# Altium footprint library CRD25DA12N-FMC.PcbLib: 152 footprints (part 8 of 10)
Each footprint in its own frame and in the unit in brackets; x right, y up, seen from the top. Pads: shape width x height; smd on the part's side, far side on the other; paste and mask are expansions set on the pad; w line width, h text height; cw(c..) or ccw(c..) is an arc to the next point about the centre after c.
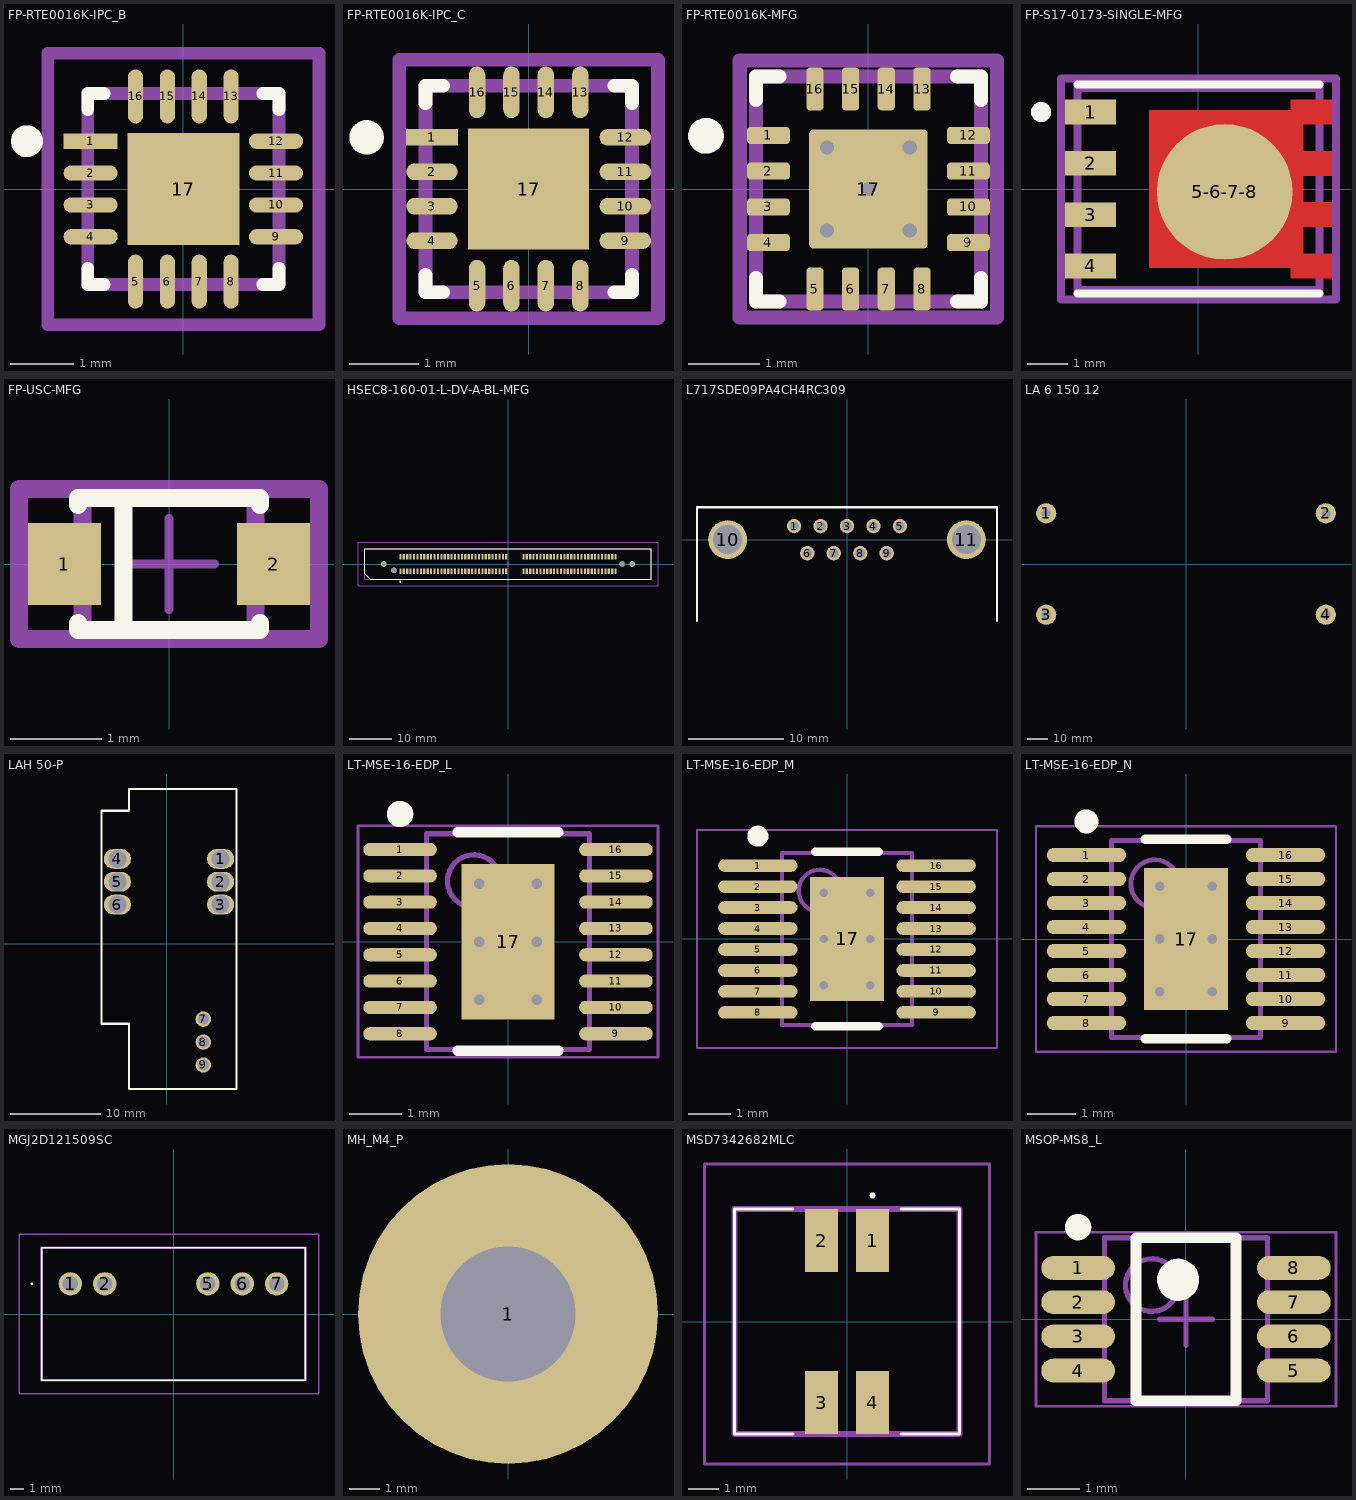
[diagram p7: the footprints below, top view; thin cyan lines are the x and y axes]

## FP-RTE0016K-IPC_B [mm]
pads (17):
  rect 0.849x0.239 smd paste+0 mask+0: 1(-1.455,0.75)
  rrect100% 0.849x0.239 smd paste+0 mask+0: 2(-1.455,0.25) 3(-1.455,-0.25) 4(-1.455,-0.75) 9(1.455,-0.75) 10(1.455,-0.25) 11(1.455,0.25) 12(1.455,0.75)
  rrect100% 0.239x0.849 smd paste+0 mask+0: 5(-0.75,-1.455) 6(-0.25,-1.455) 7(0.25,-1.455) 8(0.75,-1.455) 13(0.75,1.455) 14(0.25,1.455) 15(-0.25,1.455) 16(-0.75,1.455)
  rect 1.76x1.76 smd paste-1000 mask+0: 17(0,0)
Top Overlay:
  circle w0.25: c-2.454,0.75 r0.125
  lines w0.2: -1.5,-1.245 -1.5,-1.5 -1.245,-1.5 ; -1.5,1.245 -1.5,1.5 -1.245,1.5 ; 1.245,-1.5 1.5,-1.5 1.5,-1.245 ; 1.245,1.5 1.5,1.5 1.5,1.245
Top Paste:
  rectangle: -0.557,-0.557 0.557,0.557
Mechanical 5:
  lines w0.2: -2.129,-2.129 2.129,-2.129 2.129,2.129 -2.129,2.129 -2.129,-2.129
  text ".Designator" at 0,0.188 h1
Mechanical 13:
  lines w0.2: -1.5,-1.5 1.5,-1.5 1.5,1.5 -1.5,1.5 -1.5,-1.5
Mechanical 15:
  lines w0.2: -2.129,-2.129 2.129,-2.129 2.129,2.129 -2.129,2.129 -2.129,-2.129
Mechanical 16:
  lines w0.1: -0.5,0 0.5,0 ; 0,-0.5 0,0.5
3D body "IC_Texas_Instruments_LM51571QRTERQ1_eec.STEP": height 0.25, standoff 0, extent -2.129,-2.129 2.129,2.129

## FP-RTE0016K-IPC_C [mm]
pads (17):
  rect 0.749x0.239 smd paste+0 mask+0: 1(-1.405,0.75)
  rrect100% 0.749x0.239 smd paste+0 mask+0: 2(-1.405,0.25) 3(-1.405,-0.25) 4(-1.405,-0.75) 9(1.405,-0.75) 10(1.405,-0.25) 11(1.405,0.25) 12(1.405,0.75)
  rrect100% 0.239x0.749 smd paste+0 mask+0: 5(-0.75,-1.405) 6(-0.25,-1.405) 7(0.25,-1.405) 8(0.75,-1.405) 13(0.75,1.405) 14(0.25,1.405) 15(-0.25,1.405) 16(-0.75,1.405)
  rect 1.76x1.76 smd paste-1000 mask+0: 17(0,0)
Top Overlay:
  circle w0.25: c-2.354,0.75 r0.125
  lines w0.2: -1.5,-1.245 -1.5,-1.5 -1.245,-1.5 ; -1.5,1.245 -1.5,1.5 -1.245,1.5 ; 1.245,-1.5 1.5,-1.5 1.5,-1.245 ; 1.245,1.5 1.5,1.5 1.5,1.245
Top Paste:
  rectangle: -0.557,-0.557 0.557,0.557
Mechanical 5:
  lines w0.2: -1.879,-1.879 1.879,-1.879 1.879,1.879 -1.879,1.879 -1.879,-1.879
  text ".Designator" at 0,0.188 h1
Mechanical 13:
  lines w0.2: -1.5,-1.5 1.5,-1.5 1.5,1.5 -1.5,1.5 -1.5,-1.5
Mechanical 15:
  lines w0.2: -1.879,-1.879 1.879,-1.879 1.879,1.879 -1.879,1.879 -1.879,-1.879
Mechanical 16:
  lines w0.1: -0.5,0 0.5,0 ; 0,-0.5 0,0.5
3D body "IC_Texas_Instruments_LM51571QRTERQ1_eec.STEP": height 0.25, standoff 0, extent -1.879,-1.879 1.879,1.879

## FP-RTE0016K-MFG [mm]
pads (17):
  rrect42% 0.6x0.24 smd paste+0 mask+0: 1(-1.4,0.75) 2(-1.4,0.25) 3(-1.4,-0.25) 4(-1.4,-0.75) 9(1.4,-0.75) 10(1.4,-0.25) 11(1.4,0.25) 12(1.4,0.75)
  rrect42% 0.24x0.6 smd paste+0 mask+0: 5(-0.75,-1.4) 6(-0.25,-1.4) 7(0.25,-1.4) 8(0.75,-1.4) 13(0.75,1.4) 14(0.25,1.4) 15(-0.25,1.4) 16(-0.75,1.4)
  rrect6% 1.66x1.66 smd paste-1000 mask+0: 17(0,0)
via -0.58,0.58 diameter 0.5 hole 0.2
via 0.58,0.58 diameter 0.5 hole 0.2
via 0.58,-0.58 diameter 0.5 hole 0.2
via -0.58,-0.58 diameter 0.5 hole 0.2
via 0,0 diameter 0.5 hole 0.2
Top Overlay:
  circle w0.25: c-2.275,0.745 r0.125
  lines w0.2: -1.575,-1.245 -1.575,-1.575 -1.245,-1.575 ; -1.575,1.245 -1.575,1.575 -1.245,1.575 ; 1.245,-1.575 1.575,-1.575 1.575,-1.245 ; 1.245,1.575 1.575,1.575 1.575,1.245
Top Paste:
  region: -0.705,0.755 0.705,0.755 0.715,0.755 0.733,0.747 0.747,0.733 0.755,0.715 0.755,0.705 0.755,-0.705 0.755,-0.715 0.747,-0.733 0.733,-0.747 0.715,-0.755 0.705,-0.755 -0.705,-0.755 -0.715,-0.755 -0.733,-0.747 -0.747,-0.733 -0.755,-0.715 -0.755,-0.705 -0.755,0.705 -0.755,0.715 -0.747,0.733 -0.733,0.747 -0.715,0.755
Mechanical 5:
  lines w0.2: -1.8,-1.8 1.8,-1.8 1.8,1.8 -1.8,1.8 -1.8,-1.8
  text ".Designator" at 0,0.188 h1
Mechanical 13:
  lines w0.2: -1.575,-1.575 1.575,-1.575 1.575,1.575 -1.575,1.575 -1.575,-1.575
Mechanical 15:
  lines w0.2: -1.8,-1.8 1.8,-1.8 1.8,1.8 -1.8,1.8 -1.8,-1.8
Mechanical 16:
  lines w0.1: -0.5,0 0.5,0 ; 0,-0.5 0,0.5
3D body "IC_Texas_Instruments_XLM51571QRTERQ1_eec.STEP": height 0.25, standoff 0, extent -1.8,-1.8 1.8,1.8

## FP-S17-0173-SINGLE-MFG [mm]
pads (5):
  rect 1.27x0.61 smd paste+0 mask+0: 1(-2.67,1.905) 2(-2.67,0.635) 3(-2.67,-0.635) 4(-2.67,-1.905)
  round 3.356 smd paste+0 mask+0: 5-6-7-8(0.65,-0.069)
Top Layer:
  region: -1.215,1.955 2.285,1.955 2.285,2.21 3.305,2.21 3.305,1.6 2.595,1.6 2.595,0.94 3.305,0.94 3.305,0.33 2.595,0.33 2.595,-0.33 3.305,-0.33 3.305,-0.94 2.595,-0.94 2.595,-1.6 3.305,-1.6 3.305,-2.21 2.285,-2.21 2.285,-1.955 -1.215,-1.955
Top Overlay:
  circle w0.25: c-3.895,1.905 r0.125
  lines w0.2: -2.995,-2.585 2.995,-2.585 ; -2.995,2.585 2.995,2.585
Mechanical 5:
  lines w0.2: -3.405,-2.73 3.405,-2.73 3.405,2.73 -3.405,2.73 -3.405,-2.73
  text ".Designator" at 0,0.188 h1
Mechanical 13:
  lines w0.2: -2.995,-2.5 2.995,-2.5 2.995,2.5 -2.995,2.5 -2.995,-2.5
Mechanical 15:
  lines w0.2: -3.405,-2.73 3.405,-2.73 3.405,2.73 -3.405,2.73 -3.405,-2.73
Mechanical 16:
  lines w0.1: -0.5,0 0.5,0 ; 0,-0.5 0,0.5
3D body "Trans_Vishay_SI7461DP-T1-E3_eec.STEP": height 0.25, standoff 0, extent -3.405,-2.73 3.405,2.73

## FP-USC-MFG [mm]
pads (2):
  rect 0.8x0.9 smd paste+0 mask+0: 1(-1.15,0) 2(1.15,0)
Top Overlay:
  lines w0.2: -1,-0.65 -1,-0.725 1,-0.725 1,-0.65 ; -1,0.65 -1,0.725 1,0.725 1,0.65 ; -0.5,-0.725 -0.5,0.725
Mechanical 5:
  lines w0.2: -1.65,-0.825 -1.65,0.825 1.65,0.825 1.65,-0.825 -1.65,-0.825
  text ".Designator" at 0,0 h1
Mechanical 13:
  lines w0.2: -0.95,-0.725 -0.95,0.725 0.95,0.725 0.95,-0.725 -0.95,-0.725
Mechanical 15:
  lines w0.2: -1.65,-0.825 -1.65,0.825 1.65,0.825 1.65,-0.825 -1.65,-0.825
Mechanical 16:
  lines w0.1: -0.5,0 0.5,0 ; 0,-0.5 0,0.5
3D body "Diode_Toshiba_CUS520_H3F_eec.STEP": height 0.25, standoff 0, extent -1.65,-0.825 1.65,0.825

## HSEC8-160-01-L-DV-A-BL-MFG [mm]
pads (124):
  rect 0.5x1.2 smd paste+0 mask+0: 1(-25.2,-1.7) 2(-25.2,1.7) 3(-24.4,-1.7) 4(-24.4,1.7) 5(-23.6,-1.7) 6(-23.6,1.7) 7(-22.8,-1.7) 8(-22.8,1.7) 9(-22,-1.7) 10(-22,1.7) 11(-21.2,-1.7) 12(-21.2,1.7) 13(-20.4,-1.7) 14(-20.4,1.7) 15(-19.6,-1.7) 16(-19.6,1.7) 17(-18.8,-1.7) 18(-18.8,1.7) 19(-18,-1.7) 20(-18,1.7) 21(-17.2,-1.7) 22(-17.2,1.7) 23(-16.4,-1.7) 24(-16.4,1.7) 25(-15.6,-1.7) 26(-15.6,1.7) 27(-14.8,-1.7) 28(-14.8,1.7) 29(-14,-1.7) 30(-14,1.7) 31(-13.2,-1.7) 32(-13.2,1.7) 33(-12.4,-1.7) 34(-12.4,1.7) 35(-11.6,-1.7) 36(-11.6,1.7) 37(-10.8,-1.7) 38(-10.8,1.7) 39(-10,-1.7) 40(-10,1.7) 41(-9.2,-1.7) 42(-9.2,1.7) 43(-8.4,-1.7) 44(-8.4,1.7) 45(-7.6,-1.7) 46(-7.6,1.7) 47(-6.8,-1.7) 48(-6.8,1.7) 49(-6,-1.7) 50(-6,1.7) 51(-5.2,-1.7) 52(-5.2,1.7) 53(-4.4,-1.7) 54(-4.4,1.7) 55(-3.6,-1.7) 56(-3.6,1.7) 57(-2.8,-1.7) 58(-2.8,1.7) 59(-2,-1.7) 60(-2,1.7) 61(-1.2,-1.7) 62(-1.2,1.7) 63(-0.4,-1.7) 64(-0.4,1.7) 65(3.6,-1.7) 66(3.6,1.7) 67(4.4,-1.7) 68(4.4,1.7) 69(5.2,-1.7) 70(5.2,1.7) 71(6,-1.7) 72(6,1.7) 73(6.8,-1.7) 74(6.8,1.7) 75(7.6,-1.7) 76(7.6,1.7) 77(8.4,-1.7) 78(8.4,1.7) 79(9.2,-1.7) 80(9.2,1.7) 81(10,-1.7) 82(10,1.7) 83(10.8,-1.7) 84(10.8,1.7) 85(11.6,-1.7) 86(11.6,1.7) 87(12.4,-1.7) 88(12.4,1.7) 89(13.2,-1.7) 90(13.2,1.7) 91(14,-1.7) 92(14,1.7) 93(14.8,-1.7) 94(14.8,1.7) 95(15.6,-1.7) 96(15.6,1.7) 97(16.4,-1.7) 98(16.4,1.7) 99(17.2,-1.7) 100(17.2,1.7) 101(18,-1.7) 102(18,1.7) 103(18.8,-1.7) 104(18.8,1.7) 105(19.6,-1.7) 106(19.6,1.7) 107(20.4,-1.7) 108(20.4,1.7) 109(21.2,-1.7) 110(21.2,1.7) 111(22,-1.7) 112(22,1.7) 113(22.8,-1.7) 114(22.8,1.7) 115(23.6,-1.7) 116(23.6,1.7) 117(24.4,-1.7) 118(24.4,1.7) 119(25.2,-1.7) 120(25.2,1.7)
  round 1.34 hole 0.84 paste-2539.97 mask+0: 121(-29.05,0) 122(29.05,0)
  round 1.27 hole 1.27 unplated paste-2539.97 mask+0: ""(-26.7,-1.5) ""(26.7,0)
Top Overlay:
  circle w0.25: c-25.2,-4.125 r0.125
  lines w0.2: -33.55,-2.295 -32.28,-3.565 33.55,-3.565 33.55,3.565 -33.55,3.565 -33.55,-2.295
Top Paste:
  circle w1.27: c29.05,0 r0.635
  circle w1.27: c-29.05,0 r0.635
Mechanical 5:
  lines w0.2: -35.115,-5.09 -35.115,5.09 35.115,5.09 35.115,-5.09 -35.115,-5.09
  text ".Designator" at 0,0.188 h1
Mechanical 13:
  lines w0.2: -33.55,-3.565 -33.55,3.565 33.55,3.565 33.55,-3.565 -33.55,-3.565
Mechanical 15:
  lines w0.2: -35.115,-5.09 -35.115,5.09 35.115,5.09 35.115,-5.09 -35.115,-5.09
Mechanical 16:
  lines w0.1: -0.5,0 0.5,0 ; 0,-0.5 0,0.5
3D body "Conn_Samtec_HSEC8-160-01-L-DV-A-BL_eec.STEP": height 0.25, standoff 0, extent -35.115,-5.09 35.115,5.09

## L717SDE09PA4CH4RC309 [mm] "CONN D-SUB PLUG 9POS R/A SLDR"
height 12.55
pads (11):
  round 1.508 hole 1: 1(-5.54,1.42) 2(-2.77,1.42) 3(0,1.42) 4(2.77,1.42) 5(5.54,1.42) 6(-4.155,-1.42) 7(-1.385,-1.42) 8(1.385,-1.42) 9(4.155,-1.42)
  round 4.066 hole 3.05: 10(-12.495,0) 11(12.495,0)
Top Overlay:
  lines w0.254: -15.7,-8.5 -15.7,3.4 15.7,3.4 15.7,-8.5
3D body "Amphenol L717SDE09PA4CH4RC309 Color.STEP": height 12.55, standoff -3.2, extent -15.4,-15.6 15.405,3

## LA 6 150 12 [mm]
pads (4):
  round 10 hole 4.5: 1(-69,25) 2(69,25) 3(-69,-25) 4(69,-25)
3D body "Fischer Elektronik LA 6 150 + Fan.STEP": height 86.05, standoff 0.05, extent -104.53,-31.052 74.97,30.948

## LAH 50-P [mil]
pads (9):
  oval 118.74x86.61 hole 78.74 mask+7.87: 1(235,370) 2(235,270) 3(235,170) 5(-215,270) 6(-215,170)
  oval 118.74x86.61 hole 78.74 paste-99999 mask+7.87: 4(-215,370)
  round 67.24 hole 47.24: 7(160,-330) 8(160,-430) 9(160,-530)
Top Overlay:
  lines w10: -285,-350 -285,580 -165,580 -165,675 305,675 305,-635 -165,-635 -165,-350 -285,-350
3D body "LAH 50-P_blackbox.stp": height 789.5, standoff -182.94, extent -284.07,-636.02 304.07,675

## LT-MSE-16-EDP_L [mm] "SOP, 16-Leads, Body 4.1x3.1mm, Pitch 0.5mm, Thermal Pad 2.95x1.76mm, IPC High Density"
height 1.1
pads (17):
  oval 1.4x0.25 smd: 1(-2.05,1.75) 2(-2.05,1.25) 3(-2.05,0.75) 4(-2.05,0.25) 5(-2.05,-0.25) 6(-2.05,-0.75) 7(-2.05,-1.25) 8(-2.05,-1.75) 9(2.05,-1.75) 10(2.05,-1.25) 11(2.05,-0.75) 12(2.05,-0.25) 13(2.05,0.25) 14(2.05,0.75) 15(2.05,1.25) 16(2.05,1.75)
  rect 1.76x2.95 smd: 17(0,0)
via 0.55,-1.1 diameter 0.5 hole 0.2
via -0.55,-1.1 diameter 0.5 hole 0.2
via 0.55,0 diameter 0.5 hole 0.2
via -0.55,0 diameter 0.5 hole 0.2
via 0.55,1.1 diameter 0.5 hole 0.2
via -0.55,1.1 diameter 0.5 hole 0.2
Top Overlay:
  circle w0.25: c-2.05,2.425 r0.125
  lines w0.2: -0.951,-2.075 0.951,-2.075 ; -0.951,2.075 0.951,2.075
Mechanical 13:
  circle w0.1: c-0.65,1.15 r0.5
  lines w0.1: -1.55,-2.05 1.55,-2.05 1.55,2.05 -1.55,2.05 -1.55,-2.05
Mechanical 15:
  lines w0.05: -2.85,-2.2 2.85,-2.2 2.85,2.2 -2.85,2.2 -2.85,-2.2
  lines w0.1: -0.5,0 0.5,0 ; 0,-0.5 0,0.5
3D body: height 1.1, standoff 0.05, extent -1.55,-2.05 1.55,2.05

## LT-MSE-16-EDP_M [mm] "SOP, 16-Leads, Body 4.1x3.1mm, Pitch 0.5mm, Thermal Pad 2.95x1.76mm, IPC Low Density"
height 1.1
pads (17):
  oval 1.89x0.3 smd: 1(-2.125,1.75) 2(-2.125,1.25) 3(-2.125,0.75) 4(-2.125,0.25) 5(-2.125,-0.25) 6(-2.125,-0.75) 7(-2.125,-1.25) 8(-2.125,-1.75) 9(2.125,-1.75) 10(2.125,-1.25) 11(2.125,-0.75) 12(2.125,-0.25) 13(2.125,0.25) 14(2.125,0.75) 15(2.125,1.25) 16(2.125,1.75)
  rect 1.76x2.95 smd: 17(0,0)
via -0.55,1.1 diameter 0.5 hole 0.2
via 0.55,1.1 diameter 0.5 hole 0.2
via -0.55,0 diameter 0.5 hole 0.2
via 0.55,0 diameter 0.5 hole 0.2
via -0.55,-1.1 diameter 0.5 hole 0.2
via 0.55,-1.1 diameter 0.5 hole 0.2
Top Overlay:
  circle w0.25: c-2.125,2.45 r0.125
  lines w0.2: -0.755,-2.075 0.755,-2.075 ; -0.755,2.075 0.755,2.075
Mechanical 13:
  circle w0.1: c-0.65,1.15 r0.5
  lines w0.1: -1.55,-2.05 1.55,-2.05 1.55,2.05 -1.55,2.05 -1.55,-2.05
Mechanical 15:
  lines w0.05: -3.575,-2.6 3.575,-2.6 3.575,2.6 -3.575,2.6 -3.575,-2.6
  lines w0.1: -0.5,0 0.5,0 ; 0,-0.5 0,0.5
3D body: height 1.1, standoff 0.05, extent -1.55,-2.05 1.55,2.05

## LT-MSE-16-EDP_N [mm] "SOP, 16-Leads, Body 4.1x3.1mm, Pitch 0.5mm, Thermal Pad 2.95x1.76mm, IPC Medium Density"
height 1.1
pads (17):
  oval 1.65x0.3 smd: 1(-2.075,1.75) 2(-2.075,1.25) 3(-2.075,0.75) 4(-2.075,0.25) 5(-2.075,-0.25) 6(-2.075,-0.75) 7(-2.075,-1.25) 8(-2.075,-1.75) 9(2.075,-1.75) 10(2.075,-1.25) 11(2.075,-0.75) 12(2.075,-0.25) 13(2.075,0.25) 14(2.075,0.75) 15(2.075,1.25) 16(2.075,1.75)
  rect 1.76x2.95 smd: 17(0,0)
via -0.55,1.1 diameter 0.5 hole 0.2
via 0.55,1.1 diameter 0.5 hole 0.2
via -0.55,0 diameter 0.5 hole 0.2
via 0.55,0 diameter 0.5 hole 0.2
via -0.55,-1.1 diameter 0.5 hole 0.2
via 0.55,-1.1 diameter 0.5 hole 0.2
Top Overlay:
  circle w0.25: c-2.075,2.45 r0.125
  lines w0.2: -0.851,-2.075 0.851,-2.075 ; -0.851,2.075 0.851,2.075
Mechanical 13:
  circle w0.1: c-0.65,1.15 r0.5
  lines w0.1: -1.55,-2.05 -1.55,2.05 1.55,2.05 1.55,-2.05 -1.55,-2.05
Mechanical 15:
  lines w0.05: -3.125,-2.35 -3.125,2.35 3.125,2.35 3.125,-2.35 -3.125,-2.35
  lines w0.1: -0.5,0 0.5,0 ; 0,-0.5 0,0.5
3D body: height 1.1, standoff 0.05, extent -1.55,-2.05 1.55,2.05

## MGJ2D121509SC [mm]
pads (5):
  round 1.725 hole 1.15: 1(-7.62,2.23) 2(-5.08,2.23) 5(2.54,2.23) 6(5.08,2.23) 7(7.62,2.23)
Top Overlay:
  lines w0.1: -10.52,2.23 cw(c-10.47,2.23) -10.42,2.23 cw(c-10.47,2.23) -10.52,2.23 ; -9.75,-4.9 9.75,-4.9 9.75,4.9 -9.75,4.9 -9.75,-4.9
Top Designator:
  text ".Designator" at 7.283,0.508 h1.52
Mechanical 13:
  lines w0.2: -9.75,-4.9 9.75,-4.9 9.75,4.9 -9.75,4.9 -9.75,-4.9
Mechanical 15:
  lines w0.1: -11.42,-5.9 10.75,-5.9 10.75,5.9 -11.42,5.9 -11.42,-5.9
3D body "MGJ2D121503SC.stp": height 13.09, standoff -3.51, extent -9.9,-5.09 9.6,4.73

## MH_M4_P [mm] "M4 plated mounting hole"
pads (1):
  round 10 hole 4.5: 1(0,0)
3D body "Extended Standoff (102mm).STEP": height -0.4, standoff -102.4, extent -4,-4.619 4,4.619

## MSD7342682MLC [mm]
pads (4):
  rect 1.1x2.1 smd: 1(0.85,2.7) 2(-0.85,2.7) 3(-0.85,-2.7) 4(0.85,-2.7)
Top Overlay:
  lines w0.1: -1.8,-3.75 -3.75,-3.75 -3.75,3.75 -1.8,3.75 ; 1.8,-3.75 3.75,-3.75 3.75,3.75 1.8,3.75 ; 0.8,4.2 cw(c0.85,4.2) 0.9,4.2 cw(c0.85,4.2) 0.8,4.2
Top Designator:
  text ".Designator" at 7.618,0.758 h1.52
Mechanical 13:
  lines w0.2: -3.75,-3.75 3.75,-3.75 3.75,3.75 -3.75,3.75 -3.75,-3.75
Mechanical 15:
  lines w0.1: -4.75,-4.75 4.75,-4.75 4.75,5.25 -4.75,5.25 -4.75,-4.75
3D body "MSD7342-682MLC.stp": height 4.7, standoff 0, extent -3.75,-3.75 3.75,3.75

## MSOP-MS8_L [mm] "TSOP, 8-Leads, Body 3x3mm, Pitch 0.65mm, IPC High Density"
height 1.1
pads (8):
  oval 1.4x0.45 smd: 1(-2.05,0.975) 2(-2.05,0.325) 3(-2.05,-0.325) 4(-2.05,-0.975) 5(2.05,-0.975) 6(2.05,-0.325) 7(2.05,0.325) 8(2.05,0.975)
Top Overlay:
  circle w0.25: c-2.05,1.75 r0.125
  circle w0.4: c-0.15,0.75 r0.2
  lines w0.2: -0.95,-1.55 -0.95,1.55 0.95,1.55 0.95,-1.55 -0.95,-1.55
Mechanical 13:
  circle w0.1: c-0.65,0.65 r0.5
  lines w0.1: -1.55,-1.55 -1.55,1.55 1.55,1.55 1.55,-1.55 -1.55,-1.55
Mechanical 15:
  lines w0.05: -2.85,-1.65 -2.85,1.65 2.85,1.65 2.85,-1.65 -2.85,-1.65
  lines w0.1: -0.5,0 0.5,0 ; 0,-0.5 0,0.5
3D body: height 1.1, standoff 0, extent -1.55,-1.55 1.55,1.55